# Altium footprint library PcbLibLafe.PcbLib: 294 footprints (part 4 of 19)
Each footprint in its own frame and in the unit in brackets; x right, y up, seen from the top. Pads: shape width x height; smd on the part's side, far side on the other; paste and mask are expansions set on the pad; w line width, h text height; cw(c..) or ccw(c..) is an arc to the next point about the centre after c.
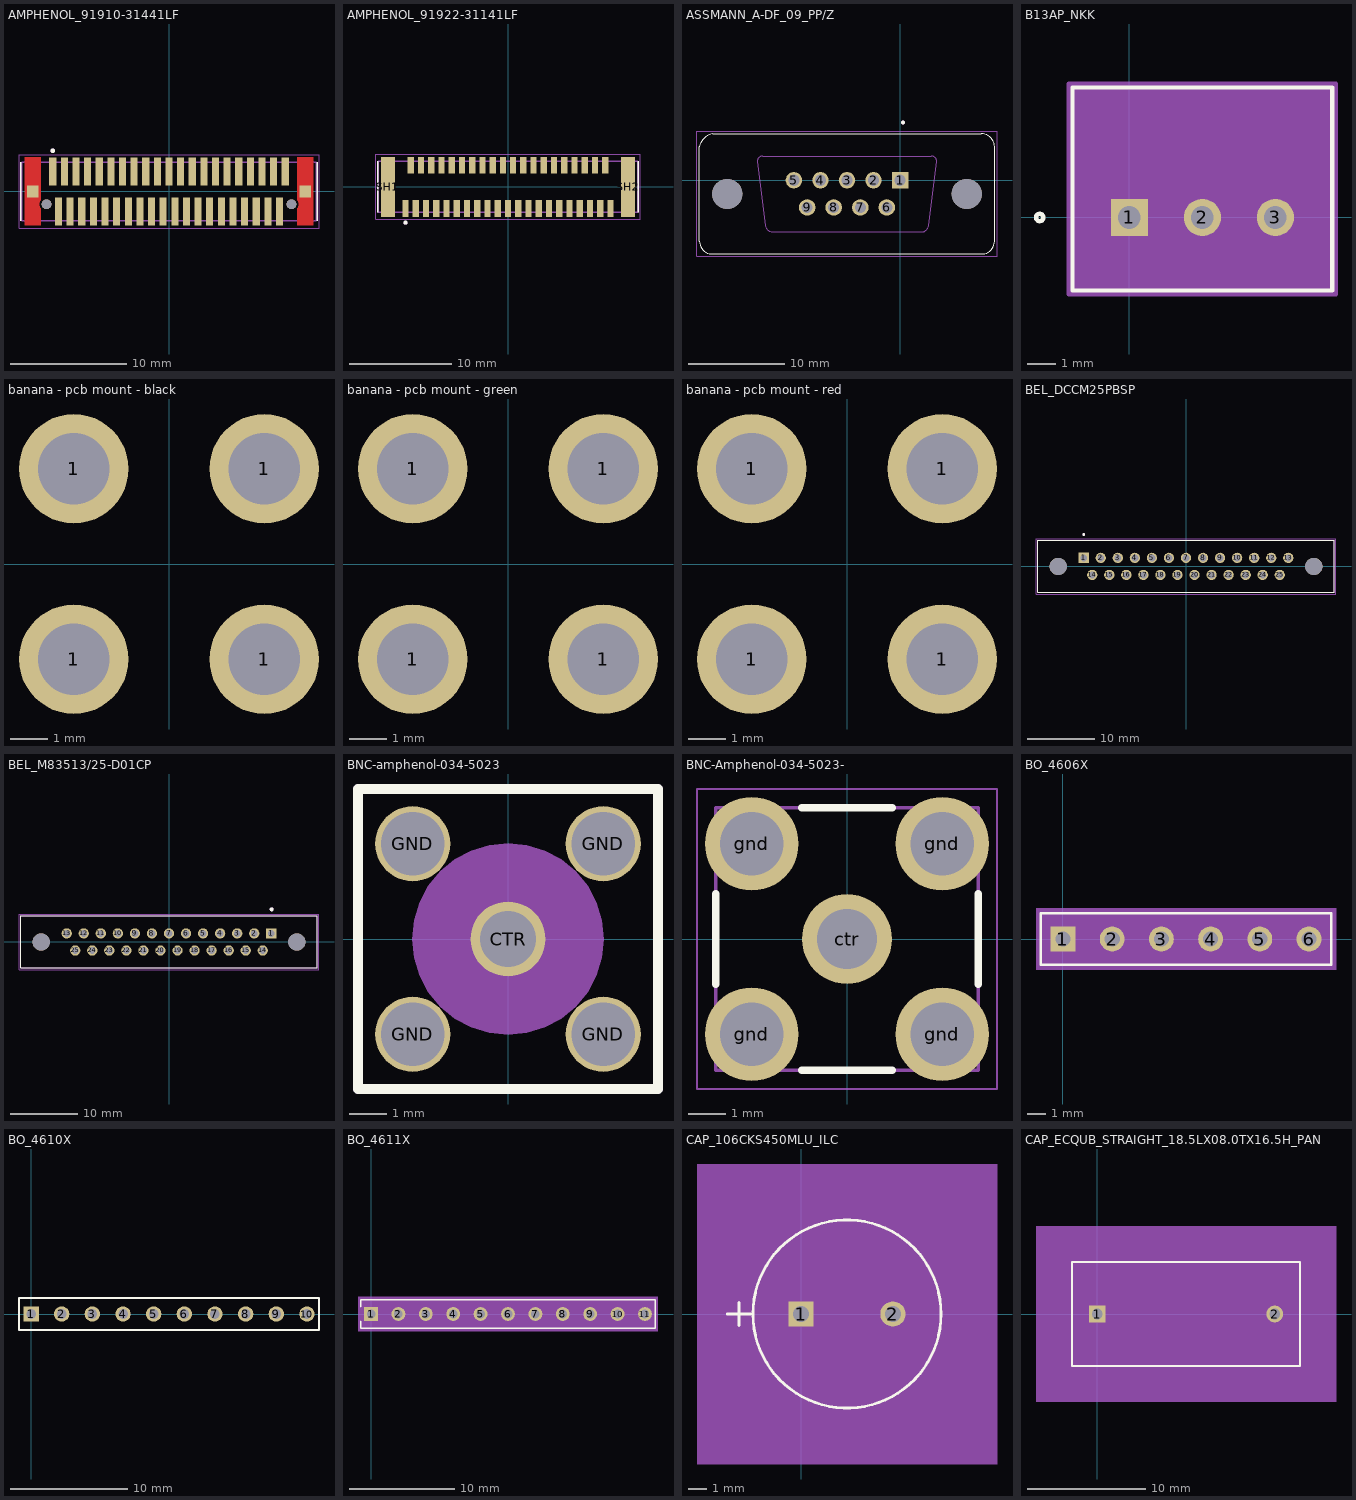
[diagram p3: the footprints below, top view; thin cyan lines are the x and y axes]

## AMPHENOL_91910-31441LF [mm]
pads (45):
  rect 0.61x2.41 smd paste-2: 1(-10,1.72) 2(-9,1.72) 3(-8,1.72) 4(-7,1.72) 5(-6,1.72) 6(-5,1.72) 7(-4,1.72) 8(-3,1.72) 9(-2,1.72) 10(-1,1.72) 11(0,1.72) 12(1,1.72) 13(2,1.72) 14(3,1.72) 15(4,1.72) 16(5,1.72) 17(6,1.72) 18(7,1.72) 19(8,1.72) 20(9,1.72) 21(10,1.72) 22(-9.5,-1.72) 23(-8.5,-1.72) 24(-7.5,-1.72) 25(-6.5,-1.72) 26(-5.5,-1.72) 27(-4.5,-1.72) 28(-3.5,-1.72) 29(-2.5,-1.72) 30(-1.5,-1.72) 31(-0.5,-1.72) 32(0.5,-1.72) 33(1.5,-1.72) 34(2.5,-1.72) 35(3.5,-1.72) 36(4.5,-1.72) 37(5.5,-1.72) 38(6.5,-1.72) 39(7.5,-1.72) 40(8.5,-1.72) 41(9.5,-1.72)
  rect 1x1 smd paste-1 mask+0: SH1(-11.72,0) SH2(11.72,0)
  round 0.84 hole 0.84 unplated: ""(-10.529,-1.1) ""(10.529,-1.1)
Top Layer:
  region: -11.02,-0.71 -11.029,-0.722 -11.038,-0.733 -11.046,-0.744 -11.054,-0.756 -11.062,-0.768 -11.069,-0.78 -11.076,-0.792 -11.083,-0.804 -11.089,-0.817 -11.096,-0.829 -11.101,-0.842 -11.107,-0.855 -11.112,-0.868 -11.117,-0.881 -11.122,-0.894 -11.127,-0.907 -11.131,-0.921 -11.135,-0.934 -11.138,-0.948 -11.141,-0.962 -11.144,-0.975 -11.147,-0.989 -11.149,-1.003 -11.151,-1.017 -11.152,-1.031 -11.153,-1.045 -11.154,-1.059 -11.155,-1.073 -11.155,-1.087 -11.155,-1.1 -11.155,-1.113 -11.155,-1.127 -11.154,-1.141 -11.153,-1.155 -11.152,-1.169 -11.151,-1.183 -11.149,-1.197 -11.147,-1.211 -11.144,-1.225 -11.141,-1.238 -11.138,-1.252 -11.135,-1.266 -11.131,-1.279 -11.127,-1.293 -11.122,-1.306 -11.117,-1.319 -11.112,-1.332 -11.107,-1.345 -11.101,-1.358 -11.096,-1.371 -11.089,-1.383 -11.083,-1.396 -11.076,-1.408 -11.069,-1.42 -11.062,-1.432 -11.054,-1.444 -11.046,-1.456 -11.038,-1.467 -11.029,-1.478 -11.02,-1.49 -11.02,-2.925 -12.42,-2.925 -12.42,2.925 -11.02,2.925
  region: 12.42,-2.925 11.02,-2.925 11.02,-1.49 11.029,-1.478 11.038,-1.467 11.046,-1.456 11.054,-1.444 11.062,-1.432 11.069,-1.42 11.076,-1.408 11.083,-1.396 11.089,-1.383 11.096,-1.371 11.101,-1.358 11.107,-1.345 11.112,-1.332 11.117,-1.319 11.122,-1.306 11.127,-1.293 11.131,-1.279 11.135,-1.266 11.138,-1.252 11.141,-1.238 11.144,-1.225 11.147,-1.211 11.149,-1.197 11.151,-1.183 11.152,-1.169 11.153,-1.155 11.154,-1.141 11.155,-1.127 11.155,-1.113 11.155,-1.11 11.155,-1.1 11.155,-1.087 11.155,-1.073 11.154,-1.059 11.153,-1.045 11.152,-1.031 11.151,-1.017 11.149,-1.003 11.147,-0.989 11.144,-0.975 11.141,-0.962 11.138,-0.948 11.135,-0.934 11.131,-0.921 11.127,-0.907 11.122,-0.894 11.117,-0.881 11.112,-0.868 11.107,-0.855 11.101,-0.842 11.096,-0.829 11.089,-0.817 11.083,-0.804 11.076,-0.792 11.069,-0.78 11.062,-0.768 11.054,-0.756 11.046,-0.744 11.038,-0.733 11.029,-0.722 11.02,-0.71 11.02,2.925 12.42,2.925
Top Overlay:
  circle w0.2: c-10,3.5 r0.1
  lines w0.127: -12.735,-2.5 -12.735,2.5 ; 12.735,-2.5 12.735,2.5
Top Paste:
  drawing of 43 lines, arcs and shapes, not listed
Top Solder:
  region: -10.92,-0.745 -10.931,-0.757 -10.939,-0.766 -10.947,-0.777 -10.955,-0.787 -10.963,-0.797 -10.97,-0.808 -10.977,-0.819 -10.984,-0.83 -10.991,-0.841 -10.997,-0.852 -11.003,-0.864 -11.009,-0.876 -11.014,-0.888 -11.019,-0.9 -11.024,-0.912 -11.028,-0.924 -11.032,-0.936 -11.036,-0.949 -11.039,-0.961 -11.042,-0.974 -11.045,-0.987 -11.048,-0.999 -11.05,-1.012 -11.052,-1.025 -11.053,-1.038 -11.054,-1.051 -11.055,-1.064 -11.055,-1.077 -11.055,-1.09 -11.055,-1.1 -11.055,-1.11 -11.055,-1.123 -11.055,-1.136 -11.054,-1.149 -11.053,-1.162 -11.052,-1.175 -11.05,-1.188 -11.048,-1.201 -11.045,-1.213 -11.042,-1.226 -11.039,-1.239 -11.036,-1.251 -11.032,-1.264 -11.028,-1.276 -11.024,-1.288 -11.019,-1.3 -11.014,-1.312 -11.009,-1.324 -11.003,-1.336 -10.997,-1.348 -10.991,-1.359 -10.984,-1.37 -10.977,-1.381 -10.97,-1.392 -10.963,-1.403 -10.955,-1.413 -10.947,-1.423 -10.939,-1.434 -10.931,-1.443 -10.92,-1.455 -10.92,-3.025 -12.52,-3.025 -12.52,3.025 -10.92,3.025
  region: 12.52,-3.025 10.92,-3.025 10.92,-1.455 10.931,-1.443 10.939,-1.434 10.947,-1.423 10.955,-1.413 10.963,-1.403 10.97,-1.392 10.977,-1.381 10.984,-1.37 10.991,-1.359 10.997,-1.348 11.003,-1.336 11.009,-1.324 11.014,-1.312 11.019,-1.3 11.024,-1.288 11.028,-1.276 11.032,-1.264 11.036,-1.251 11.039,-1.239 11.042,-1.226 11.045,-1.213 11.048,-1.201 11.05,-1.188 11.052,-1.175 11.053,-1.162 11.054,-1.149 11.055,-1.136 11.055,-1.123 11.055,-1.11 11.055,-1.1 11.055,-1.09 11.055,-1.077 11.055,-1.064 11.054,-1.051 11.053,-1.038 11.052,-1.025 11.05,-1.012 11.048,-0.999 11.045,-0.987 11.042,-0.974 11.039,-0.961 11.036,-0.949 11.032,-0.936 11.028,-0.924 11.024,-0.912 11.019,-0.9 11.014,-0.888 11.009,-0.876 11.003,-0.864 10.997,-0.852 10.991,-0.841 10.984,-0.83 10.977,-0.819 10.97,-0.808 10.963,-0.797 10.955,-0.787 10.947,-0.777 10.939,-0.766 10.931,-0.757 10.92,-0.745 10.92,3.025 12.52,3.025
Mechanical 13:
  circle w0.2: c-10,3.5 r0.1
  lines w0.127: -12.65,-2.5 12.65,-2.5 12.65,2.5 -12.65,2.5 -12.65,-2.5
Mechanical 15:
  lines w0.05: -12.9,-3.175 12.9,-3.175 12.9,3.175 -12.9,3.175 -12.9,-3.175
3D body "91910-21541LF.STEP": height 6.59, standoff -0.5, extent -12.598,-2.769 12.702,2.821

## AMPHENOL_91922-31141LF [mm]
pads (43):
  rect 0.61x1.63 smd paste-2: 1(-10,-2.11) 2(-9,-2.11) 3(-8,-2.11) 4(-7,-2.11) 5(-6,-2.11) 6(-5,-2.11) 7(-4,-2.11) 8(-3,-2.11) 9(-2,-2.11) 10(-1,-2.11) 11(0,-2.11) 12(1,-2.11) 13(2,-2.11) 14(3,-2.11) 15(4,-2.11) 16(5,-2.11) 17(6,-2.11) 18(7,-2.11) 19(8,-2.11) 20(9,-2.11) 21(10,-2.11) 22(-9.5,2.11) 23(-8.5,2.11) 24(-7.5,2.11) 25(-6.5,2.11) 26(-5.5,2.11) 27(-4.5,2.11) 28(-3.5,2.11) 29(-2.5,2.11) 30(-1.5,2.11) 31(-0.5,2.11) 32(0.5,2.11) 33(1.5,2.11) 34(2.5,2.11) 35(3.5,2.11) 36(4.5,2.11) 37(5.5,2.11) 38(6.5,2.11) 39(7.5,2.11) 40(8.5,2.11) 41(9.5,2.11)
  rect 1.4x5.85 smd paste-4: SH1(-11.72,0) SH2(11.72,0)
Top Overlay:
  circle w0.2: c-10,-3.5 r0.1
  lines w0.127: -12.735,-2.5 -12.735,2.5 ; 12.735,-2.5 12.735,2.5
Top Paste:
  drawing of 43 lines, arcs and shapes, not listed
Mechanical 13:
  circle w0.2: c-10,-3.5 r0.1
  lines w0.127: -12.65,-2.5 -12.65,2.5 12.65,2.5 12.65,-2.5 -12.65,-2.5
Mechanical 15:
  lines w0.05: -12.9,-3.175 -12.9,3.175 12.9,3.175 12.9,-3.175 -12.9,-3.175
3D body "91922-31141LF.step": height 3.41, standoff 0, extent -13.17,-2.654 12.13,2.936

## ASSMANN_A-DF_09_PP/Z [mm]
pads (11):
  rect 1.725x1.725 hole 1.15: 1(0,0)
  round 1.725 hole 1.15: 2(-2.77,0) 3(-5.54,0) 4(-8.31,0) 5(-11.08,0) 6(-1.385,-2.84) 7(-4.155,-2.84) 8(-6.925,-2.84) 9(-9.695,-2.84)
  round 3.15 hole 3.15 unplated: ""(-18.035,-1.42) ""(6.955,-1.42)
Top Overlay:
  circle w0.2: c0.3,6.02 r0.1
  lines w0.127: -20.945,-6.385 -20.945,3.5 ; -20.945,-6.385 ccw(c-19.587,-6.338) -19.54,-7.695 8.46,-7.695 ccw(c8.507,-6.338) 9.865,-6.385 ; -20.945,3.499 cw(c-19.275,3.174) -19.541,4.855 ; -19.54,4.855 8.46,4.855 ; 8.461,4.855 cw(c8.485,3.475) 9.865,3.499 ; 9.865,-6.385 9.865,3.5
Mechanical 13:
  circle w0.2: c0.3,6.02 r0.1
  lines w0.127: -14.05,-4.77 -14.9,1.98 cw(c-14.35,1.98) -14.35,2.53 3.27,2.53 cw(c3.27,1.98) 3.82,1.98 2.97,-4.77 ; -14.05,-4.768 ccw(c-13.369,-4.684) -13.345,-5.37 ; -13.35,-5.37 2.27,-5.37 2.52,-5.37 ; 2.265,-5.37 ccw(c2.289,-4.684) 2.97,-4.768
Mechanical 15:
  lines w0.05: -21.195,-7.945 -21.195,5.105 10.115,5.105 10.115,-7.945 -21.195,-7.945
3D body "A-DF_09_PP_Z.step": height 12.3, standoff -4.4, extent -20.93,-7.75 9.88,4.8

## B13AP_NKK [mil]
pads (3):
  rect 51x51 / inner round 60 / far side rect 51x51 hole 31 paste-99999 mask+0: 1(0,0)
  round 51 / inner round 60 / far side round 51 hole 31 paste-99999 mask+0: 2(100,0) 3(200,0)
Top Overlay:
  circle w6: c-123,0 r5
  lines w6: -78,-100 -78,178 278,178 278,-100 -78,-100
Mechanical 13:
  circle w0: c100,39 r118
  circle w0: c-53,0 r5
  lines w1: -73,-95 -73,173 273,173 273,-95 -73,-95
Mechanical 15:
  region: 283,-105 -83,-105 -83,183 283,183
  lines w6: -83,-105 283,-105 283,183 -83,183 -83,-105
3D body "B13AP.stp": height 901.18, standoff -122, extent -73,-94 273,174

## banana - pcb mount - black [mil]
pads (4):
  round 115 hole 75: 1(-100,-100) 1(-100,100) 1(100,-100) 1(100,100)
3D body "CT3151-0.STEP": height 765.22, standoff -116.14, extent -265.75,-990.55 265.75,100

## banana - pcb mount - green [mil]
pads (4):
  round 115 hole 75: 1(-100,-100) 1(-100,100) 1(100,-100) 1(100,100)
3D body "CT3151-5.STEP": height 765.74, standoff -118.11, extent -255.75,-1010.55 275.75,80

## banana - pcb mount - red [mil]
pads (4):
  round 115 hole 75: 1(-100,-100) 1(-100,100) 1(100,-100) 1(100,100)
3D body "CT3151-2.step": height 765.22, standoff -116.14, extent -265.75,-970.55 265.75,120

## BEL_DCCM25PBSP [mm]
pads (27):
  rect 1.53x1.53 hole 1.02: 1(-15.24,1.27)
  round 1.53 hole 1.02: 2(-12.7,1.27) 3(-10.16,1.27) 4(-7.62,1.27) 5(-5.08,1.27) 6(-2.54,1.27) 7(0,1.27) 8(2.54,1.27) 9(5.08,1.27) 10(7.62,1.27) 11(10.16,1.27) 12(12.7,1.27) 13(15.24,1.27) 14(-13.97,-1.27) 15(-11.43,-1.27) 16(-8.89,-1.27) 17(-6.35,-1.27) 18(-3.81,-1.27) 19(-1.27,-1.27) 20(1.27,-1.27) 21(3.81,-1.27) 22(6.35,-1.27) 23(8.89,-1.27) 24(11.43,-1.27) 25(13.97,-1.27)
  round 2.57 hole 2.57 unplated: ""(-19.05,0) ""(19.05,0)
Top Overlay:
  circle w0.2: c-15.24,4.74 r0.1
  lines w0.127: -22.1,-3.875 22.1,-3.875 22.1,3.875 -22.1,3.875 -22.1,-3.875
Mechanical 13:
  circle w0.2: c-15.24,4.74 r0.1
  lines w0.127: -22.1,-3.875 22.1,-3.875 22.1,3.875 -22.1,3.875 -22.1,-3.875
Mechanical 15:
  lines w0.05: -22.35,-4.125 22.35,-4.125 22.35,4.125 -22.35,4.125 -22.35,-4.125
3D body "DCCM25PBSP.step": height 13.84, standoff -3.15, extent -22.098,-3.912 22.098,3.912

## BEL_M83513/25-D01CP [mm]
pads (27):
  rect 1.53x1.53 hole 1.02: 1(15.24,1.27)
  round 1.53 hole 1.02: 2(12.7,1.27) 3(10.16,1.27) 4(7.62,1.27) 5(5.08,1.27) 6(2.54,1.27) 7(0,1.27) 8(-2.54,1.27) 9(-5.08,1.27) 10(-7.62,1.27) 11(-10.16,1.27) 12(-12.7,1.27) 13(-15.24,1.27) 14(13.97,-1.27) 15(11.43,-1.27) 16(8.89,-1.27) 17(6.35,-1.27) 18(3.81,-1.27) 19(1.27,-1.27) 20(-1.27,-1.27) 21(-3.81,-1.27) 22(-6.35,-1.27) 23(-8.89,-1.27) 24(-11.43,-1.27) 25(-13.97,-1.27)
  round 2.57 hole 2.57 unplated: ""(-19.05,0) ""(19.05,0)
Top Overlay:
  circle w0.3: c15.29,4.865 r0.15
  lines w0.127: -22.1,-3.875 22.1,-3.875 22.1,3.875 -22.1,3.875 -22.1,-3.875
Mechanical 13:
  circle w0.3: c15.29,4.865 r0.15
  lines w0.127: -22.1,-3.875 22.1,-3.875 22.1,3.875 -22.1,3.875 -22.1,-3.875
Mechanical 15:
  lines w0.05: -22.35,-4.13 22.35,-4.13 22.35,4.13 -22.35,4.13 -22.35,-4.13

## BNC-amphenol-034-5023 [mm] "BNC thru hole, panel mount"
pads (5):
  round 2 hole 1.5 mask+0.075: CTR(0,0)
  round 2 hole 1.7 mask+0.075: GND(-2.54,-2.54) GND(-2.54,2.54) GND(2.54,-2.54) GND(2.54,2.54)
Top Overlay:
  lines w0.254: -4,-4 4,-4 4,4 -4,4 -4,-4
Mechanical 1:
  lines w0.254: -4,-4 4,-4 4,4 -4,4 -4,-4
  text "J1" at -0.497,4.192 h0.76
Mechanical 3:
  pour cut-out: 2.552,0 2.503,0.498 2.358,0.977 2.122,1.418 1.805,1.805 1.418,2.122 0.977,2.358 0.498,2.503 0,2.552 -0.498,2.503 -0.977,2.358 -1.418,2.122 -1.805,1.805 -2.122,1.418 -2.358,0.977 -2.503,0.498 -2.552,0 -2.503,-0.498 -2.358,-0.977 -2.122,-1.418 -1.805,-1.805 -1.418,-2.122 -0.977,-2.358 -0.498,-2.503 0,-2.552 0.498,-2.503 0.977,-2.358 1.418,-2.122 1.805,-1.805 2.122,-1.418 2.358,-0.977 2.503,-0.498
3D body "amphenol-34-5023.stp": height 13.16, standoff -3.8, extent -3.75,-3.75 3.75,3.75

## BNC-Amphenol-034-5023- [mm]
pads (5):
  round 2.4 hole 1.6: ctr(0,0)
  round 2.5 hole 1.7: gnd(-2.54,-2.54) gnd(-2.54,2.54) gnd(2.54,-2.54) gnd(2.54,2.54)
Top Overlay:
  lines w0.2: -3.5,-1.2 -3.5,1.2 ; -1.2,-3.5 1.2,-3.5 ; -1.2,3.5 1.2,3.5 ; 3.5,-1.2 3.5,1.2
Mechanical 13:
  lines w0.1: -3.5,-3.5 -3.5,3.5 3.5,3.5 3.5,-3.5 -3.5,-3.5
Mechanical 15:
  lines w0.05: -4,-4 -4,4 4,4 4,-4 -4,-4
3D body "amphenol-34-5023.stp": height 13.26, standoff -3.7, extent -3.7,-3.85 3.8,3.65

## BO_4606X [mil]
pads (6):
  rect 52x52 hole 32 mask+0: 1(0,0)
  round 52 hole 32 mask+0: 2(103,0) 3(206,0) 4(309,0) 5(412,0) 6(515,0)
Top Overlay:
  lines w6: -46.5,-54 561.5,-54 561.5,54 -46.5,54 -46.5,-54
Mechanical 5:
  region: -56.5,64 571.5,64 571.5,-64 -56.5,-64
Mechanical 13:
  lines w1: -41.5,-49 556.5,-49 556.5,49 -41.5,49 -41.5,-49
Mechanical 15:
  region: 566.5,59 -51.5,59 -51.5,-59 566.5,-59
  lines w6: -51.5,-59 -51.5,59 566.5,59 566.5,-59 -51.5,-59
3D body "BO_4606X.step": height 200, standoff -187.99, extent -41.5,-49.02 556.5,49.02

## BO_4610X [mil]
pads (10):
  rect 52x52 hole 32 mask+0: 1(0,0)
  round 52 hole 32 mask+0: 2(103,0) 3(206,0) 4(309,0) 5(412,0) 6(515,0) 7(618,0) 8(721,0) 9(824,0) 10(927,0)
Top Overlay:
  lines w6: -40.5,-54 967.5,-54 967.5,54 -40.5,54 -40.5,-54
3D body: height 10, standoff 0, extent 0,0 10,10
3D body "4610x.stp": height 115.94, standoff -213.98, extent -37.03,-50 961,47.81

## BO_4611X [mil]
pads (11):
  rect 52x52 hole 32 mask+0: 1(0,0)
  round 52 hole 32 mask+0: 2(103,0) 3(206,0) 4(309,0) 5(412,0) 6(515,0) 7(618,0) 8(721,0) 9(824,0) 10(927,0) 11(1030,0)
Top Overlay:
  lines w6: -39,-27.62 -39,-54 1069,-54 1069,54 -39,54 -39,27.62
Mechanical 5:
  region: -49,64 1079,64 1079,-64 -49,-64
Mechanical 13:
  lines w1: -34,-49 -34,49 1064,49 1064,-49 -34,-49
Mechanical 15:
  region: 1074,59 -44,59 -44,-59 1074,-59
  lines w6: -44,-59 1074,-59 1074,59 -44,59 -44,-59
3D body "BO_4611X.step": height 200, standoff -187.99, extent -34.02,-49.02 1064.02,49.02

## CAP_106CKS450MLU_ILC [mil]
pads (2):
  rect 54x54 hole 34 mask+0: 1(0,0)
  round 54 hole 34 mask+0: 2(196.85,0)
Top Overlay:
  circle w6: c98.43,0 r202
  lines w6: -158.57,0 -108.57,0 ; -133.57,-25 -133.57,25
Mechanical 5:
  region: 420.43,-322 -223.57,-322 -223.57,322 420.43,322
Mechanical 13:
  circle w0: c98.43,0 r197
  lines w1: -158.57,0 -108.57,0 ; -133.57,-25 -133.57,25
Mechanical 15:
  region: -108.57,85.24 13.19,207 183.66,207 305.43,85.24 305.43,-85.24 183.66,-207 13.19,-207 -108.57,-85.24
  lines w1: -108.57,-85.24 13.19,-207 183.66,-207 305.43,-85.24 305.43,85.24 183.66,207 13.19,207 -108.57,85.24 -108.57,-85.24
3D body "CAP_106CKS450MLU_ILC.step": height 787.6, standoff -172.01, extent -98.58,-196.88 296.4,196.88

## CAP_ECQUB_STRAIGHT_18.5LX08.0TX16.5H_PAN [mil]
pads (2):
  rect 56x56 hole 36 mask+0: 1(0,0)
  round 56 hole 36 mask+0: 2(590.55,0)
Top Overlay:
  lines w6: -83.72,-172.5 -83.72,172.5 674.28,172.5 674.28,-172.5 -83.72,-172.5
Mechanical 5:
  region: 794.28,-292.5 -203.72,-292.5 -203.72,292.5 794.28,292.5
Mechanical 13:
  lines w1: -78.72,-167.5 -78.72,167.5 669.28,167.5 669.28,-167.5 -78.72,-167.5
Mechanical 15:
  region: 679.28,-177.5 -88.72,-177.5 -88.72,177.5 679.28,177.5
  lines w6: -88.72,-177.5 679.28,-177.5 679.28,177.5 -88.72,177.5 -88.72,-177.5
3D body: height 10, standoff 0, extent 0,0 10,10
3D body "ECQUBAF104K.step": height 688.98, standoff -748.03, extent -54.17,-155.48 674.17,159.48